# Altium footprint library 5ko.PcbLib: 126 footprints (part 3 of 8)
Each footprint in its own frame and in the unit in brackets; x right, y up, seen from the top. Pads: shape width x height; smd on the part's side, far side on the other; paste and mask are expansions set on the pad; w line width, h text height; cw(c..) or ccw(c..) is an arc to the next point about the centre after c.
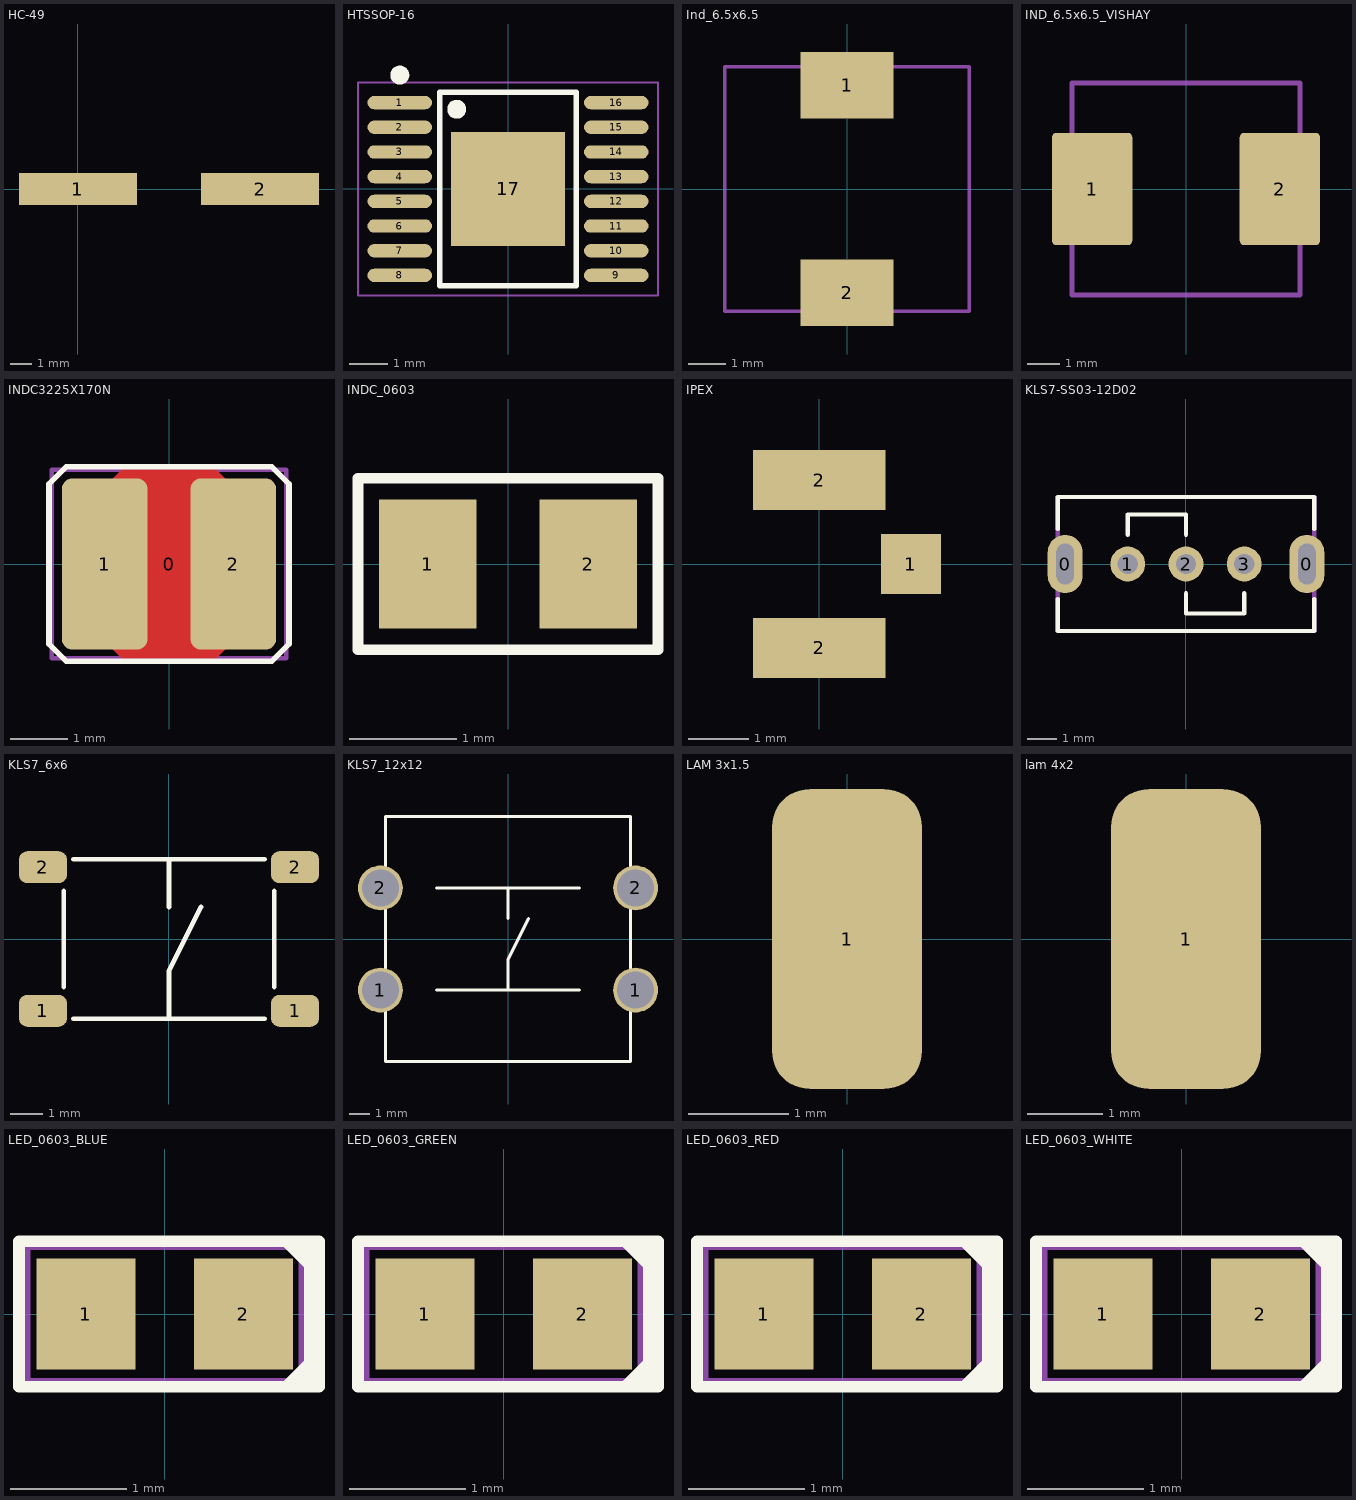
[diagram p2: the footprints below, top view; thin cyan lines are the x and y axes]

## HC-49 [mm]
pads (2):
  rect 5.5x1.5 smd: 1(0,0) 2(8.5,0)
3D body "HC49_SMD.step": height 4.3, standoff 0, extent -1.9,-2.25 10.4,2.25

## HTSSOP-16 [mm] "HTSOP, 16-Leads, Body 5,00x4,40mm, Pitch 0,65mm, IPC Medium Density"
height 1.2
pads (17):
  oval 1.7x0.35 smd: 1(-2.85,2.275) 2(-2.85,1.625) 3(-2.85,0.975) 4(-2.85,0.325) 5(-2.85,-0.325) 6(-2.85,-0.975) 7(-2.85,-1.625) 8(-2.85,-2.275) 9(2.85,-2.275) 10(2.85,-1.625) 11(2.85,-0.975) 12(2.85,-0.325) 13(2.85,0.325) 14(2.85,0.975) 15(2.85,1.625) 16(2.85,2.275)
  rect 3x3 smd: 17(0,0)
Top Overlay:
  circle w0.25: c-1.35,2.1 r0.125
  circle w0.25: c-2.85,3 r0.125
  lines w0.15: -1.8,-2.55 -1.8,2.55 1.8,2.55 1.8,-2.55 -1.8,-2.55
Mechanical 15:
  lines w0.05: -3.95,-2.8 -3.95,2.8 3.95,2.8 3.95,-2.8 -3.95,-2.8
  lines w0.1: -0.5,0 0.5,0 ; 0,-0.5 0,0.5
3D body "User Library-TSSOP-16-1.step": height 1.1, standoff 0, extent -3.2,-2.5 3.2,2.5

## Ind_6.5x6.5 [mm]
pads (2):
  rect 2.5x1.8 smd: 1(0,2.8) 2(0,-2.8)
Mechanical 15:
  lines w0.1: -3.3,-3.3 3.3,-3.3 3.3,3.3 -3.3,3.3 -3.3,-3.3
  text ".Designator" at -1.8,-0.2 h0.5
3D body "srr0604-6r8ml.stp": height 4.8, standoff 0, extent -3.25,-3.25 3.25,3.25

## IND_6.5x6.5_VISHAY [mm]
height 3
pads (2):
  rrect10% 2.5x3.5 smd mask+0.07: 1(-2.925,0) 2(2.925,0)
Mechanical 15:
  lines w0.15: -3.556,-3.302 3.556,-3.302 3.556,3.302 -3.556,3.302 -3.556,2.286 -3.556,-3.302
  text ".Designator" at -1.927,-0.2 h0.5
3D body "ihlp2525czer1r0m11.stp": height 2.89, standoff 0, extent -3.538,-3.37 3.538,3.3

## INDC3225X170N [mm] "Chip Inductor, 2-Leads, Body 3.2x2.5mm, IPC Medium Density"
height 1.7
pads (3):
  round 0.508 on Mech15: 0(0,0)
  rrect25% 1.5x3 smd: 1(-1.125,0) 2(1.125,0)
Top Layer:
  pour cut-out: -1.125,1.35 -0.825,1.65 0.825,1.65 1.125,1.35 1.125,-1.35 0.825,-1.65 -0.825,-1.65 -1.125,-1.35
Top Overlay:
  lines w0.1: -2.1,-1.4 -2.1,1.4 -1.8,1.7 1.8,1.7 2.1,1.4 2.1,-1.4 1.8,-1.7 -1.8,-1.7 -2.1,-1.4
Mechanical 13:
  lines w0.05: -1.7,-1.35 1.7,-1.35 1.7,1.35 -1.7,1.35 -1.7,-1.35
Mechanical 15:
  lines w0.076: -2.05,-1.65 -2.05,1.65 2.05,1.65 2.05,-1.65 -2.05,-1.65
3D body "INDC3225X170N.STEP": height 1.7, standoff 0, extent -1.71,-1.36 1.71,1.36

## INDC_0603 [mm] "Chip Inductor, 2-Leads, Body 1,60x1,00mm, IPC Medium Density"
height 1
pads (2):
  rect 0.91x1.2 smd: 1(-0.75,0) 2(0.75,0)
Top Overlay:
  lines w0.1: -1.4,-0.8 -1.4,0.8 1.4,0.8 1.4,-0.8 -1.4,-0.8
Mechanical 15:
  lines w0.05: -1.4,-0.8 1.4,-0.8 1.4,0.8 -1.4,0.8 -1.4,-0.8
  text ".Designator" at -1.1,-0.2 h0.5
3D body "Coilcraft-0603ME.step": height 0.83, standoff -0.01, extent -0.9,-0.589 0.9,0.589

## IPEX [mm]
pads (3):
  rect 1x1 smd: 1(1.524,0)
  rect 2.2x1 smd: 2(0,-1.397) 2(0,1.397)
3D body "User Library-20279-001.step": height 1.25, standoff -0.01, extent -1.55,-1.5 1.55,1.5

## KLS7-SS03-12D02 [mm] "Slide Switch"
height 7.7
pads (5):
  oval 1.2x2 hole 0.6 slot 1.4 at 90 deg: 0(-4.15,0) 0(4.15,0)
  round 1.2 hole 0.7: 1(-2,0) 2(0,0) 3(2,0)
Top Overlay:
  lines w0.15: -4.4,-1.2 -4.4,-2.3 4.4,-2.3 4.4,-1.2 ; -4.4,1.2 -4.4,2.3 4.4,2.3 4.4,1.2 ; -2,1 -2,1.7 0,1.7 0,1 ; 0,-1 0,-1.7 2,-1.7 2,-1
Mechanical 15:
  lines w0.15: -4.4,-2.3 -4.4,2.3 4.4,2.3 4.4,-2.3 -4.4,-2.3
  text ".Designator" at -1.9,-0.2 h0.5
3D body "User Library-KLS7-SS03-12D02-EG-3.step": height 7.33, standoff -2.8, extent -4.35,-2.25 4.35,2.25

## KLS7_6x6 [mm] "SMD Button"
pads (4):
  rrect50% 1.5x1 smd mask+0.07: 1(-3.95,-2.25) 1(3.95,-2.25) 2(-3.95,2.25) 2(3.95,2.25)
Top Overlay:
  lines w0.15: -3.3,-1.5 -3.3,1.5 ; -3,-2.5 3,-2.5 ; -3,2.5 3,2.5 ; 0,-2.5 0,-1 1,1 ; 0,1 0,2.5 ; 3.3,-1.5 3.3,1.5
3D body "TS6-SMT_H-5.0.step": height 5, standoff 0, extent -4,-3 4,3

## KLS7_12x12 [mm] "DIP Button"
pads (4):
  round 2.2 hole 1.8 mask+0.07: 1(-6.25,-2.5) 1(6.25,-2.5) 2(-6.25,2.5) 2(6.25,2.5)
Top Overlay:
  lines w0.15: -3.5,-2.5 3.5,-2.5 ; -3.5,2.5 3.5,2.5 ; 0,-2.5 0,-1 1,1 ; 0,1 0,2.5 ; -6,-6 -6,6 6,6 6,-6 -6,-6
Mechanical 15:
  lines w0.15: -6,-6 6,-6 6,6 -6,6 -6,-6
  text ".Designator" at -2,-0.1 h0.5
3D body: height 3, standoff 0, extent -6,-6 6,6
3D body: height 5, standoff 3, extent -3.5,-3.499 3.5,3.499

## LAM 3x1.5 [mm]
pads (1):
  rrect50% 1.5x3 smd mask+0.07: 1(0,0)

## lam 4x2 [mm]
pads (1):
  rrect50% 2x4 smd mask+0.07: 1(0,0)

## LED_0603_BLUE [mm]
pads (2):
  rect 0.85x0.95 smd: 1(-0.675,0) 2(0.675,0)
Top Overlay:
  region: 1.2,-0.625 1.325,-0.625 1.325,0.625 1.2,0.625
  region: 0.975,-0.625 1.25,-0.35 1.25,-0.625
  region: 0.975,0.625 1.25,0.35 1.25,0.625
  lines w0.1: -1.25,-0.625 1.325,-0.625 1.325,0.625 -1.25,0.625 -1.25,-0.625
Mechanical 15:
  lines w0.1: -1.2,-0.6 1.2,-0.6 1.2,0.6 -1.2,0.6 -1.2,-0.6
  text ".Designator" at -0.9,-0.1 h0.3
3D body "User Library-LED_0603_B.STEP": height 0.6, standoff 0, extent -0.8,-0.4 0.8,0.4

## LED_0603_GREEN [mm]
pads (2):
  rect 0.85x0.95 smd: 1(-0.675,0) 2(0.675,0)
Top Overlay:
  region: 1.2,-0.625 1.325,-0.625 1.325,0.625 1.2,0.625
  region: 0.975,-0.625 1.25,-0.35 1.25,-0.625
  region: 0.975,0.625 1.25,0.35 1.25,0.625
  lines w0.1: -1.25,-0.625 1.325,-0.625 1.325,0.625 -1.25,0.625 -1.25,-0.625
Mechanical 15:
  lines w0.1: -1.2,-0.6 1.2,-0.6 1.2,0.6 -1.2,0.6 -1.2,-0.6
  text ".Designator" at -0.9,-0.1 h0.3
3D body "User Library-LED_0603_G.STEP": height 0.6, standoff 0, extent -0.8,-0.4 0.8,0.4

## LED_0603_RED [mm]
pads (2):
  rect 0.85x0.95 smd: 1(-0.675,0) 2(0.675,0)
Top Overlay:
  region: 0.975,0.625 1.25,0.35 1.25,0.625
  region: 0.975,-0.625 1.25,-0.35 1.25,-0.625
  region: 1.2,-0.625 1.325,-0.625 1.325,0.625 1.2,0.625
  lines w0.1: -1.25,-0.625 -1.25,0.625 1.325,0.625 1.325,-0.625 -1.25,-0.625
Mechanical 15:
  lines w0.1: -1.2,-0.6 -1.2,0.6 1.2,0.6 1.2,-0.6 -1.2,-0.6
  text ".Designator" at -0.9,-0.1 h0.3
3D body "User Library-LED_0603_R.STEP": height 0.6, standoff 0, extent -0.8,-0.4 0.8,0.4

## LED_0603_WHITE [mm]
pads (2):
  rect 0.85x0.95 smd: 1(-0.675,0) 2(0.675,0)
Top Overlay:
  region: 1.2,-0.625 1.325,-0.625 1.325,0.625 1.2,0.625
  region: 0.975,-0.625 1.25,-0.35 1.25,-0.625
  region: 0.975,0.625 1.25,0.35 1.25,0.625
  lines w0.1: -1.25,-0.625 1.325,-0.625 1.325,0.625 -1.25,0.625 -1.25,-0.625
Mechanical 15:
  lines w0.1: -1.2,-0.6 -1.2,0.6 1.2,0.6 1.2,-0.6 -1.2,-0.6
  text ".Designator" at -0.9,-0.1 h0.3
3D body "User Library-LED_0603_WS.STEP": height 0.6, standoff 0, extent -0.8,-0.4 0.8,0.4